# Altium footprint library HW_Dron_V2.PcbLib: 55 footprints (part 2 of 4)
Each footprint in its own frame and in the unit in brackets; x right, y up, seen from the top. Pads: shape width x height; smd on the part's side, far side on the other; paste and mask are expansions set on the pad; w line width, h text height; cw(c..) or ccw(c..) is an arc to the next point about the centre after c.
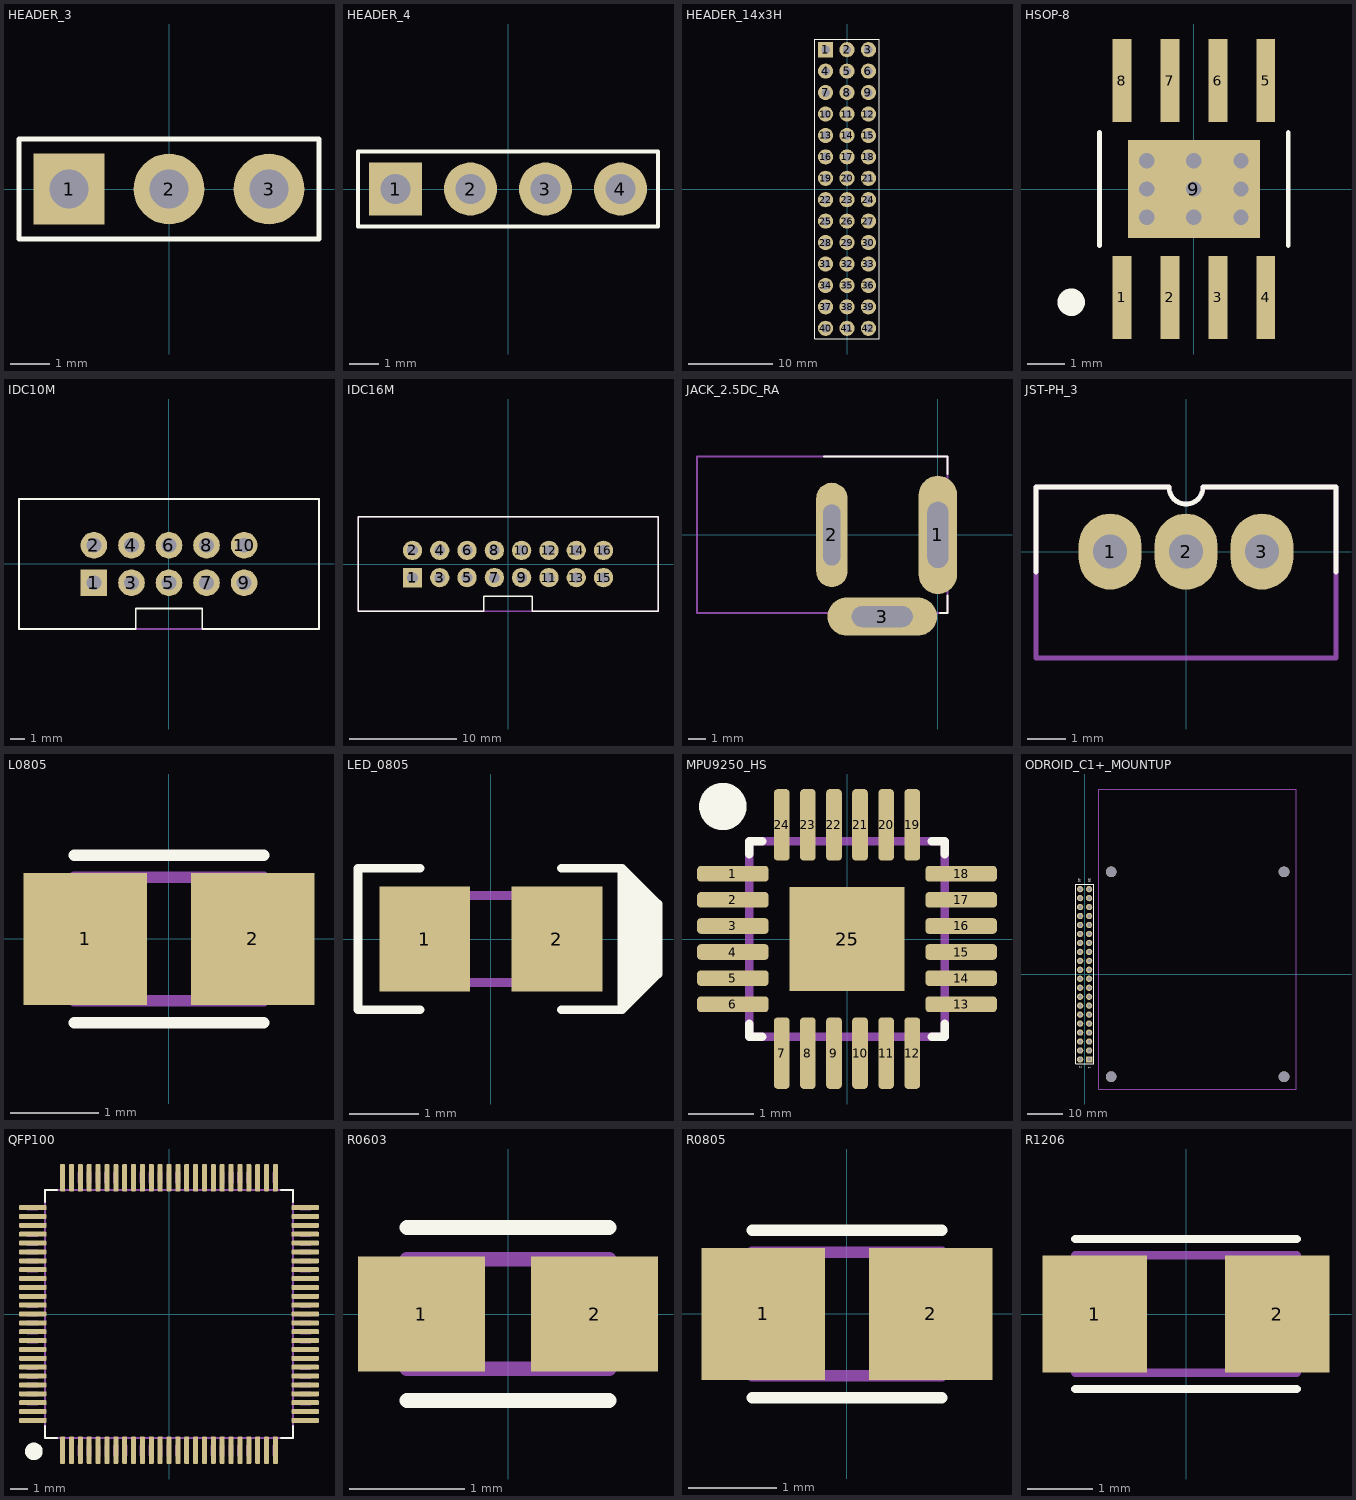
[diagram p1: the footprints below, top view; thin cyan lines are the x and y axes]

## HEADER_3 [mm]
pads (3):
  rect 1.8x1.8 hole 1: 1(-2.54,0)
  round 1.8 hole 1: 2(0,0) 3(2.54,0)
Top Overlay:
  lines w0.127: -3.81,-1.27 -3.81,1.27 3.81,1.27 3.81,-1.27 -3.81,-1.27
3D body: height 5.94, standoff -2.94, extent -3.81,-1.27 3.81,1.27

## HEADER_4 [mm]
pads (4):
  rect 1.8x1.8 hole 1: 1(-3.81,0)
  round 1.8 hole 1: 2(-1.27,0) 3(1.27,0) 4(3.81,0)
Top Overlay:
  lines w0.127: -5.08,-1.27 -5.08,1.27 5.08,1.27 5.08,-1.27 -5.08,-1.27
3D body: height 5.94, standoff -2.94, extent -5.08,-1.27 5.08,1.27

## HEADER_14x3H [mm]
pads (42):
  rect 1.8x1.8 hole 1: 1(-2.54,16.51)
  round 1.8 hole 1: 2(0,16.51) 3(2.54,16.51) 4(-2.54,13.97) 5(0,13.97) 6(2.54,13.97) 7(-2.54,11.43) 8(0,11.43) 9(2.54,11.43) 10(-2.54,8.89) 11(0,8.89) 12(2.54,8.89) 13(-2.54,6.35) 14(0,6.35) 15(2.54,6.35) 16(-2.54,3.81) 17(0,3.81) 18(2.54,3.81) 19(-2.54,1.27) 20(0,1.27) 21(2.54,1.27) 22(-2.54,-1.27) 23(0,-1.27) 24(2.54,-1.27) 25(-2.54,-3.81) 26(0,-3.81) 27(2.54,-3.81) 28(-2.54,-6.35) 29(0,-6.35) 30(2.54,-6.35) 31(-2.54,-8.89) 32(0,-8.89) 33(2.54,-8.89) 34(-2.54,-11.43) 35(0,-11.43) 36(2.54,-11.43) 37(-2.54,-13.97) 38(0,-13.97) 39(2.54,-13.97) 40(-2.54,-16.51) 41(0,-16.51) 42(2.54,-16.51)
Top Overlay:
  lines w0.127: -3.81,-17.78 3.81,-17.78 3.81,17.78 -3.81,17.78 -3.81,-17.78
3D body: height 9.72, standoff -2.92, extent -11.05,-17.75 3.05,17.81

## HSOP-8 [mm]
pads (9):
  rect 0.5x2.2 smd: 1(-1.905,-2.875) 2(-0.635,-2.875) 3(0.635,-2.875) 4(1.905,-2.875) 5(1.905,2.875) 6(0.635,2.875) 7(-0.635,2.875) 8(-1.905,2.875)
  rect 3.5x2.6 smd: 9(0,0)
via -1.25,0.75 diameter 0.711 hole 0.406
via 0,0.75 diameter 0.711 hole 0.406
via 1.25,0.75 diameter 0.711 hole 0.406
via -1.25,0 diameter 0.711 hole 0.406
via 0,0 diameter 0.711 hole 0.406
via 1.25,0 diameter 0.711 hole 0.406
via -1.25,-0.75 diameter 0.711 hole 0.406
via 0,-0.75 diameter 0.711 hole 0.406
via 1.25,-0.75 diameter 0.711 hole 0.406
Top Overlay:
  circle w0.381: c-3.25,-3 r0.173
  lines w0.127: -2.5,-1.5 -2.5,1.5 ; 2.5,-1.5 2.5,1.5
3D body: height 1.75, standoff 0, extent -2.5,-3.1 2.5,3.1

## IDC10M [mm] "10 pin IDC male header connector"
height 9.1
pads (10):
  rect 1.8x1.8 hole 1: 1(-5.08,-1.27)
  round 1.8 hole 1: 2(-5.08,1.27) 3(-2.54,-1.27) 4(-2.54,1.27) 5(0,-1.27) 6(0,1.27) 7(2.54,-1.27) 8(2.54,1.27) 9(5.08,-1.27) 10(5.08,1.27)
Top Overlay:
  lines w0.127: -10.15,-4.4 -2.25,-4.4 -2.25,-3 2.25,-3 2.25,-4.4 10.15,-4.4 10.15,4.4 -10.15,4.4 -10.15,-4.4
Mechanical 13:
  lines w0.127: 10.15,4.4 10.15,-4.4 -10.15,-4.4 -10.15,4.4 10.15,4.4
3D body: height 9.3, standoff -3.1, extent -10.15,-4.4 10.15,4.7

## IDC16M [mm] "16 pin IDC male header connector"
height 9.1
pads (16):
  rect 1.8x1.8 hole 1: 1(-8.89,-1.27)
  round 1.8 hole 1: 2(-8.89,1.27) 3(-6.35,-1.27) 4(-6.35,1.27) 5(-3.81,-1.27) 6(-3.81,1.27) 7(-1.27,-1.27) 8(-1.27,1.27) 9(1.27,-1.27) 10(1.27,1.27) 11(3.81,-1.27) 12(3.81,1.27) 13(6.35,-1.27) 14(6.35,1.27) 15(8.89,-1.27) 16(8.89,1.27)
Top Overlay:
  lines w0.127: -13.96,-4.4 -2.25,-4.4 -2.25,-3 2.25,-3 2.25,-4.4 13.96,-4.4 13.96,4.4 -13.96,4.4 -13.96,-4.4
Mechanical 13:
  lines w0.127: -13.96,-4.4 -13.96,4.4 13.96,4.4 13.96,-4.4 -13.96,-4.4
3D body: height 9.13, standoff -3.27, extent -13.96,-4.25 13.96,4.6

## JACK_2.5DC_RA [mm]
pads (3):
  oval 2.2x6.8 hole 1.2 slot 3.8 at 90 deg: 1(0,0)
  oval 1.8x6 hole 1 slot 3.5 at 90 deg: 2(-6.1,0)
  oval 6.3x2.2 hole 1.2 slot 3.5 at 0 deg: 3(-3.2,-4.7)
Top Overlay:
  lines w0.127: -6.549,4.5 0.55,4.5 0.55,3.5 ; 0.127,-4.5 0.55,-4.5 0.55,-3.5
Mechanical 13:
  lines w0.127: -13.85,-4.5 -13.85,4.5 0.55,4.5 0.55,-4.5 -13.85,-4.5
3D body: height 11, standoff -3.5, extent -13.804,-5 0.596,4.5

## JST-PH_3 [mm]
pads (3):
  oval 1.65x2 hole 0.9: 1(-2,0) 2(0,0) 3(2,0)
Top Overlay:
  lines w0.127: -3.95,-0.545 -3.95,1.7 -0.448,1.7 ccw(c0,1.7) 0.448,1.7 3.95,1.7 3.95,-0.545
Mechanical 13:
  lines w0.127: -3.95,-2.8 3.95,-2.8 3.95,1.7 0.448,1.7 cw(c0,1.7) -0.448,1.7 -3.95,1.7 -3.95,-2.8
3D body: height 6.1, standoff -3.3, extent -3.95,-2.794 3.95,1.706

## L0805 [mm] "Inductor SMD 0805"
height 1.2
pads (2):
  rect 1.4x1.5 smd: 1(-0.95,0) 2(0.95,0)
Top Overlay:
  lines w0.127: -1.075,-0.95 1.075,-0.95 ; -1.075,0.95 1.075,0.95
Mechanical 13:
  lines w0.127: -1.075,0.7 -1.075,-0.7 1.075,-0.7 1.075,0.7 -1.075,0.7
3D body: height 1.3, standoff 0, extent -1,-0.6 1,0.6

## LED_0805 [mm] "0805 Package Chip LED"
height 1
pads (2):
  rect 1.3x1.5 smd: 1(-0.95,0) 2(0.95,0)
Top Overlay:
  region: 1.884,1.016 2.4,0.5 2.4,-0.5 1.884,-1.016
  lines w0.127: -1.016,-1.016 -1.905,-1.016 -1.905,1.016 -1.016,1.016 ; 1.016,-1.016 1.884,-1.016 ; 1.016,1.016 1.884,1.016 ; 1.884,-1.016 1.884,1.016 ; 1.884,-1.016 2.4,-0.5 2.4,0.5 1.884,1.016
Mechanical 13:
  lines w0.127: -1,-0.625 -1,0.625 1,0.625 1,-0.625 -1,-0.625
3D body: height 1.1, standoff 0, extent -1.01,-0.625 1.01,0.625

## MPU9250_HS [mm] "IMU 9 DOF"
pads (25):
  rrect50% 1.1x0.24 smd mask+0.051: 1(-1.75,1) 2(-1.75,0.6) 3(-1.75,0.2) 4(-1.75,-0.2) 5(-1.75,-0.6) 6(-1.75,-1) 13(1.75,-1) 14(1.75,-0.6) 15(1.75,-0.2) 16(1.75,0.2) 17(1.75,0.6) 18(1.75,1)
  rrect50% 0.24x1.1 smd mask+0.051: 7(-1,-1.75) 8(-0.6,-1.75) 9(-0.2,-1.75) 10(0.2,-1.75) 11(0.6,-1.75) 12(1,-1.75) 19(1,1.75) 20(0.6,1.75) 21(0.2,1.75) 22(-0.2,1.75) 23(-0.6,1.75) 24(-1,1.75)
  rect 1.76x1.6 smd mask+0.051: 25(0,0)
Top Overlay:
  circle w0.381: c-1.905,2.032 r0.173
  lines w0.127: -1.5,-1.3 -1.5,-1.5 -1.3,-1.5 ; -1.5,1.3 -1.5,1.5 -1.3,1.5 ; 1.3,-1.5 1.5,-1.5 1.5,-1.3 ; 1.3,1.5 1.5,1.5 1.5,1.3
Mechanical 13:
  lines w0.127: -1.5,-1.5 1.5,-1.5 1.5,1.5 -1.5,1.5 -1.5,-1.5
3D body: height -0.4, standoff -1.45, extent -1.51,-1.524 1.51,1.496

## ODROID_C1+_MOUNTUP [mm]
pads (44):
  rect 1.8x1.8 hole 1: 1(1.27,-24.13)
  round 1.8 hole 1: 2(-1.27,-24.13) 3(1.27,-21.59) 4(-1.27,-21.59) 5(1.27,-19.05) 6(-1.27,-19.05) 7(1.27,-16.51) 8(-1.27,-16.51) 9(1.27,-13.97) 10(-1.27,-13.97) 11(1.27,-11.43) 12(-1.27,-11.43) 13(1.27,-8.89) 14(-1.27,-8.89) 15(1.27,-6.35) 16(-1.27,-6.35) 17(1.27,-3.81) 18(-1.27,-3.81) 19(1.27,-1.27) 20(-1.27,-1.27) 21(1.27,1.27) 22(-1.27,1.27) 23(1.27,3.81) 24(-1.27,3.81) 25(1.27,6.35) 26(-1.27,6.35) 27(1.27,8.89) 28(-1.27,8.89) 29(1.27,11.43) 30(-1.27,11.43) 31(1.27,13.97) 32(-1.27,13.97) 33(1.27,16.51) 34(-1.27,16.51) 35(1.27,19.05) 36(-1.27,19.05) 37(1.27,21.59) 38(-1.27,21.59) 39(1.27,24.13) 40(-1.27,24.13)
  round 3 hole 3 unplated: ""(7.5,-29) ""(7.5,29) ""(56.5,-29) ""(56.5,29)
Top Overlay:
  lines w0.127: -2.54,-25.4 -2.54,25.475 2.54,25.475 2.54,-25.4 -2.54,-25.4
  text "39" at 1,27.25 h0.76
  text "40" at -1.75,27.25 h0.76
  text "2" at -1.5,-26 h0.76
  text "1" at 1,-26.25 h0.76
Mechanical 13:
  lines w0.127: 4,-32.5 60,-32.5 60,52.5 4,52.5 4,-32.5
3D body: height 36.9, standoff 16, extent 3.5,-32.75 60.5,53.75
3D body: height 5.94, standoff -2.94, extent -2.54,0 2.54,25.4
3D body: height 5.94, standoff -2.94, extent -2.54,-25.4 2.54,0

## QFP100 [mm]
pads (100):
  rrect50% 0.28x1.56 smd: 1(-6,-7.68) 2(-5.5,-7.68) 3(-5,-7.68) 4(-4.5,-7.68) 5(-4,-7.68) 6(-3.5,-7.68) 7(-3,-7.68) 8(-2.5,-7.68) 9(-2,-7.68) 10(-1.5,-7.68) 11(-1,-7.68) 12(-0.5,-7.68) 13(0,-7.68) 14(0.5,-7.68) 15(1,-7.68) 16(1.5,-7.68) 17(2,-7.68) 18(2.5,-7.68) 19(3,-7.68) 20(3.5,-7.68) 21(4,-7.68) 22(4.5,-7.68) 23(5,-7.68) 24(5.5,-7.68) 25(6,-7.68) 51(6,7.68) 52(5.5,7.68) 53(5,7.68) 54(4.5,7.68) 55(4,7.68) 56(3.5,7.68) 57(3,7.68) 58(2.5,7.68) 59(2,7.68) 60(1.5,7.68) 61(1,7.68) 62(0.5,7.68) 63(0,7.68) 64(-0.5,7.68) 65(-1,7.68) 66(-1.5,7.68) 67(-2,7.68) 68(-2.5,7.68) 69(-3,7.68) 70(-3.5,7.68) 71(-4,7.68) 72(-4.5,7.68) 73(-5,7.68) 74(-5.5,7.68) 75(-6,7.68)
  rrect50% 1.56x0.28 smd: 26(7.68,-6) 27(7.68,-5.5) 28(7.68,-5) 29(7.68,-4.5) 30(7.68,-4) 31(7.68,-3.5) 32(7.68,-3) 33(7.68,-2.5) 34(7.68,-2) 35(7.68,-1.5) 36(7.68,-1) 37(7.68,-0.5) 38(7.68,0) 39(7.68,0.5) 40(7.68,1) 41(7.68,1.5) 42(7.68,2) 43(7.68,2.5) 44(7.68,3) 45(7.68,3.5) 46(7.68,4) 47(7.68,4.5) 48(7.68,5) 49(7.68,5.5) 50(7.68,6) 76(-7.68,6) 77(-7.68,5.5) 78(-7.68,5) 79(-7.68,4.5) 80(-7.68,4) 81(-7.68,3.5) 82(-7.68,3) 83(-7.68,2.5) 84(-7.68,2) 85(-7.68,1.5) 86(-7.68,1) 87(-7.68,0.5) 88(-7.68,0) 89(-7.68,-0.5) 90(-7.68,-1) 91(-7.68,-1.5) 92(-7.68,-2) 93(-7.68,-2.5) 94(-7.68,-3) 95(-7.68,-3.5) 96(-7.68,-4) 97(-7.68,-4.5) 98(-7.68,-5) 99(-7.68,-5.5) 100(-7.68,-6)
Top Overlay:
  circle w0.635: c-7.62,-7.747 r0.18
  lines w0.12: -7,-6.32 -7,-7 -6.32,-7 ; -7,6.32 -7,7 -6.32,7 ; 6.32,-7 7,-7 7,-6.32 ; 6.32,7 7,7 7,6.32
Mechanical 12:
  drawing of 404 lines, arcs and shapes, not listed
Mechanical 13:
  lines w0.127: -7,-7 7,-7 7,7 -7,7 -7,-7
3D body: height -0.39, standoff -2.01, extent -8,-8 8,8

## R0603 [mm] "Resistor SMD 0603"
height 0.6
pads (2):
  rect 1.1x1 smd: 1(-0.75,0) 2(0.75,0)
Top Overlay:
  lines w0.127: -0.875,-0.75 0.875,-0.75 ; -0.875,0.75 0.875,0.75
Mechanical 13:
  lines w0.127: -0.875,-0.475 0.875,-0.475 0.875,0.475 -0.875,0.475 -0.875,-0.475
3D body: height 0.48, standoff -0.03, extent -0.8,-0.43 0.8,0.43

## R0805 [mm] "Resistor SMD 0805"
height 0.65
pads (2):
  rect 1.4x1.5 smd: 1(-0.95,0) 2(0.95,0)
Top Overlay:
  lines w0.127: -1.075,-0.95 1.075,-0.95 ; -1.075,0.95 1.075,0.95
Mechanical 13:
  lines w0.127: -1.075,0.7 -1.075,-0.7 1.075,-0.7 1.075,0.7 -1.075,0.7
3D body: height 0.43, standoff -0.03, extent -1,-0.63 1,0.63

## R1206 [mm] "Resistor SMD 1206"
height 0.71
pads (2):
  rect 1.6x1.8 smd: 1(-1.4,0) 2(1.4,0)
Top Overlay:
  lines w0.127: -1.7,-1.15 1.7,-1.15 ; -1.7,1.15 1.7,1.15
Mechanical 13:
  lines w0.127: -1.7,-0.9 -1.7,0.9 1.7,0.9 1.7,-0.9 -1.7,-0.9
3D body: height 0.53, standoff -0.03, extent -1.6,-0.83 1.6,0.83